# Altium footprint library Dr.Xiong_20160818.PcbLib: 266 footprints (part 8 of 17)
Each footprint in its own frame and in the unit in brackets; x right, y up, seen from the top. Pads: shape width x height; smd on the part's side, far side on the other; paste and mask are expansions set on the pad; w line width, h text height; cw(c..) or ccw(c..) is an arc to the next point about the centre after c.
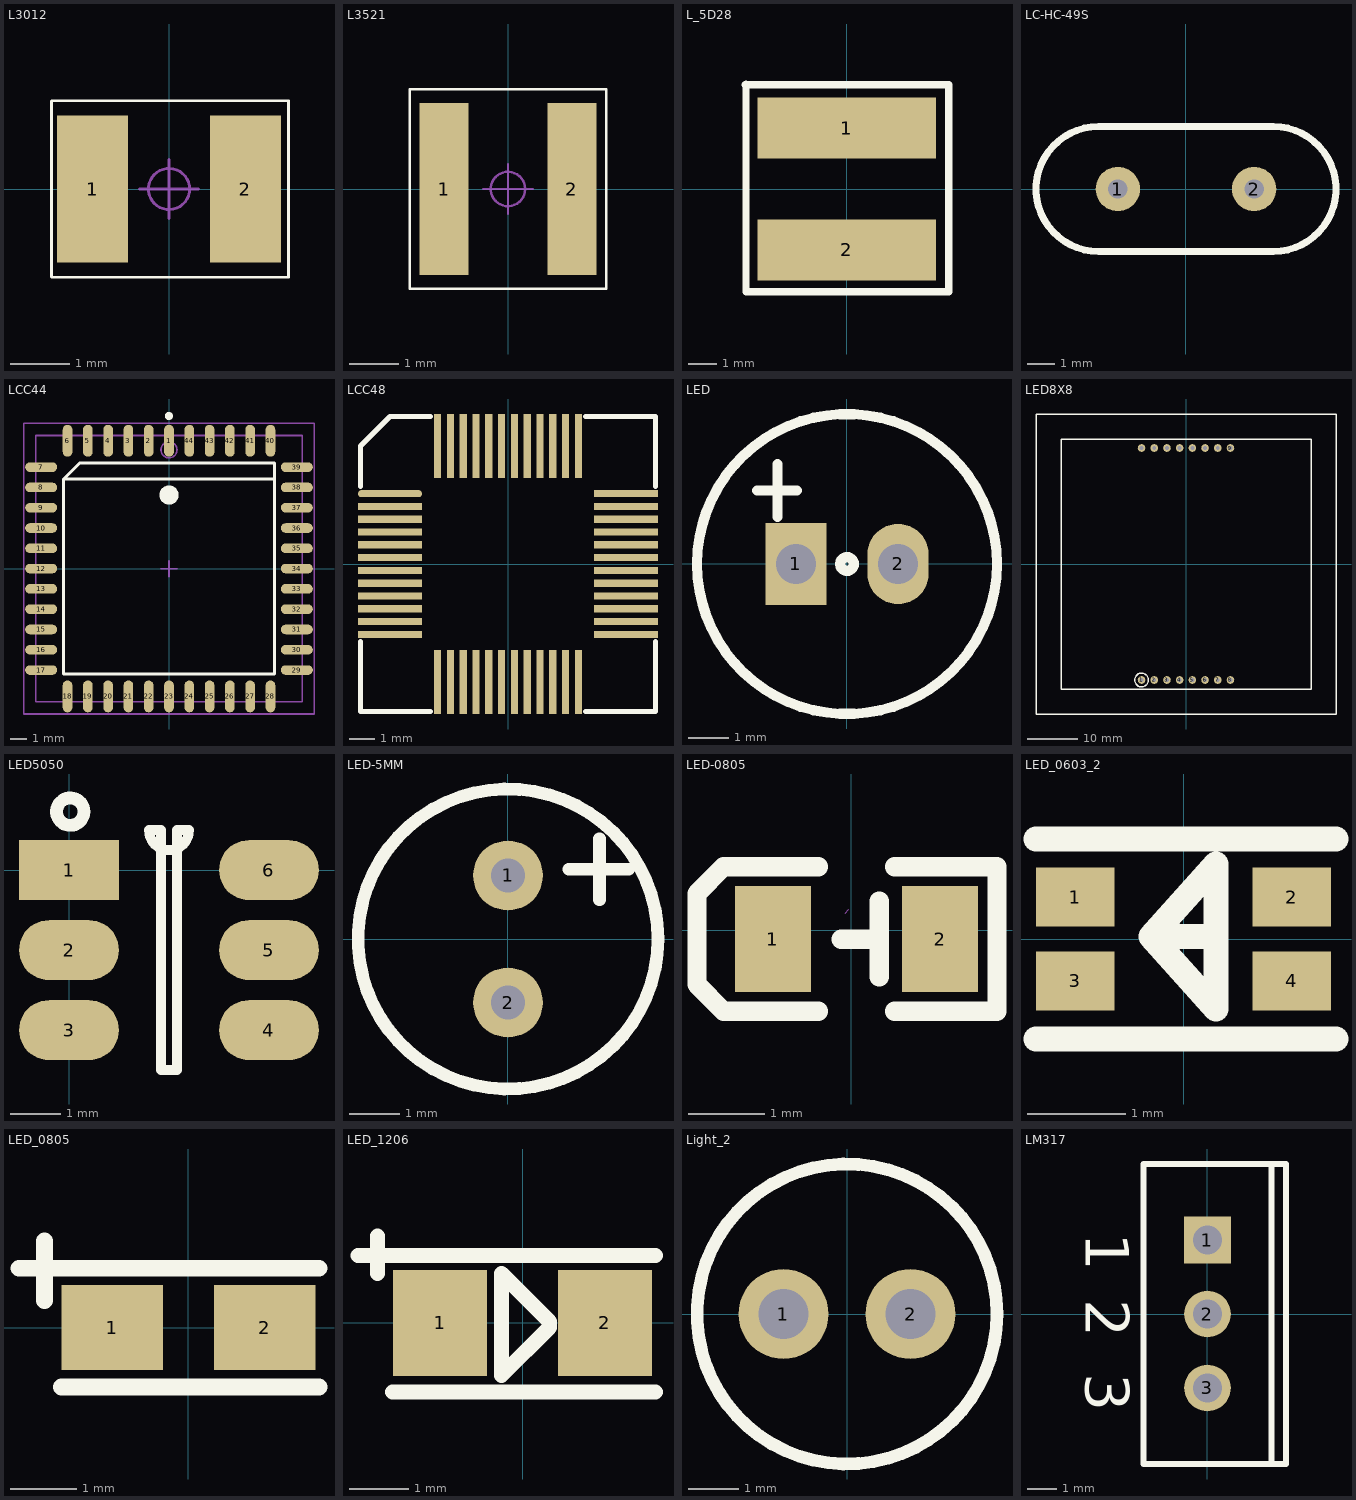
[diagram p7: the footprints below, top view; thin cyan lines are the x and y axes]

## L3012 [mm]
pads (2):
  rect 1.2x2.5 smd: 1(-1.3,0) 2(1.3,0)
Top Overlay:
  lines w0.05: -2,-1.499 2.032,-1.5 2.032,1.5 -2,1.499 -2,-1.499
Mechanical 16:
  circle w0.05: c0,0 r0.35
  lines w0.05: -0.5,0 0.5,0 ; 0,-0.5 0,0.5

## L3521 [mm]
pads (2):
  rect 1x3.5 smd: 1(-1.3,0) 2(1.3,0)
Top Overlay:
  lines w0.05: -2,-2.028 2,-2.028 2,2.028 -2,2.028 -2,-2.028
Mechanical 16:
  circle w0.05: c0,0 r0.35
  lines w0.05: -0.5,0 0.5,0 ; 0,-0.5 0,0.5

## L_5D28 [mm]
pads (2):
  rect 6.3x2.15 smd: 1(0,2.15) 2(0,-2.15)
Top Overlay:
  lines w0.254: -3.581,3.683 3.607,3.683 3.607,-3.632 -3.556,-3.632 -3.556,3.708

## LC-HC-49S [mm]
pads (2):
  round 1.6 hole 0.7: 1(-2.45,0) 2(2.45,0)
Top Overlay:
  lines w0.254: -3.15,-2.248 cw(c-3.15,0) -3.15,2.248 3.15,2.248 cw(c3.15,0) 3.15,-2.248 -3.15,-2.248
3D body "hc-49s_n.stp": height 3.6, standoff -2.9, extent -5.388,-2.27 5.412,2.23

## LCC44 [mm]
pads (44):
  oval 0.6x2 smd: 1(0,8) 2(-1.27,8) 3(-2.54,8) 4(-3.81,8) 5(-5.08,8) 6(-6.35,8) 18(-6.35,-8) 19(-5.08,-8) 20(-3.81,-8) 21(-2.54,-8) 22(-1.27,-8) 23(0,-8) 24(1.27,-8) 25(2.54,-8) 26(3.81,-8) 27(5.08,-8) 28(6.35,-8) 40(6.35,8) 41(5.08,8) 42(3.81,8) 43(2.54,8) 44(1.27,8)
  oval 2x0.6 smd: 7(-8,6.35) 8(-8,5.08) 9(-8,3.81) 10(-8,2.54) 11(-8,1.27) 12(-8,0) 13(-8,-1.27) 14(-8,-2.54) 15(-8,-3.81) 16(-8,-5.08) 17(-8,-6.35) 29(8,-6.35) 30(8,-5.08) 31(8,-3.81) 32(8,-2.54) 33(8,-1.27) 34(8,0) 35(8,1.27) 36(8,2.54) 37(8,3.81) 38(8,5.08) 39(8,6.35)
Top Overlay:
  circle w0.6: c0,4.6 r0.3
  circle w0.25: c0,9.55 r0.125
  lines w0.2: 6.6,5.6 -6.6,5.6 ; -6.6,5.6 -6.6,-6.6 6.6,-6.6 6.6,6.6 -5.6,6.6 -6.6,5.6
Mechanical 13:
  circle w0.1: c0,7.43 r0.5
  lines w0.1: -8.33,-8.33 8.33,-8.33 8.33,8.33 -8.33,8.33 -8.33,-8.33
Mechanical 15:
  lines w0.1: -0.5,0 0.5,0 ; 0,-0.5 0,0.5 ; -9.1,-9.1 9.1,-9.1 9.1,9.1 -9.1,9.1 -9.1,-9.1
3D body: height 4.58, standoff 0, extent -8.33,-8.33 8.33,8.33

## LCC48 [mm]
pads (48):
  oval 2.5x0.28 smd: 1(-4.615,2.75)
  rect 2.5x0.28 smd: 2(-4.615,2.25) 3(-4.615,1.75) 4(-4.615,1.25) 5(-4.615,0.75) 6(-4.615,0.25) 7(-4.615,-0.25) 8(-4.615,-0.75) 9(-4.615,-1.25) 10(-4.615,-1.75) 11(-4.615,-2.25) 12(-4.615,-2.75) 25(4.615,-2.75) 26(4.615,-2.25) 27(4.615,-1.75) 28(4.615,-1.25) 29(4.615,-0.75) 30(4.615,-0.25) 31(4.615,0.25) 32(4.615,0.75) 33(4.615,1.25) 34(4.615,1.75) 35(4.615,2.25) 36(4.615,2.75)
  rect 0.28x2.5 smd: 13(-2.75,-4.615) 14(-2.25,-4.615) 15(-1.75,-4.615) 16(-1.25,-4.615) 17(-0.75,-4.615) 18(-0.25,-4.615) 19(0.25,-4.615) 20(0.75,-4.615) 21(1.25,-4.615) 22(1.75,-4.615) 23(2.25,-4.615) 24(2.75,-4.615) 37(2.75,4.615) 38(2.25,4.615) 39(1.75,4.615) 40(1.25,4.615) 41(0.75,4.615) 42(0.25,4.615) 43(-0.25,4.615) 44(-0.75,4.615) 45(-1.25,4.615) 46(-1.75,4.615) 47(-2.25,4.615) 48(-2.75,4.615)
Top Overlay:
  lines w0.2: -5.765,-3.03 -5.765,-5.765 -3.03,-5.765 ; -5.765,3.03 -5.765,4.615 -4.615,5.765 -3.03,5.765 ; 3.03,-5.765 5.765,-5.765 5.765,-3.03 ; 3.03,5.765 5.765,5.765 5.765,3.03

## LED [mm]
pads (2):
  rect 1.524x2.032 hole 1: 1(-1.27,0)
  oval 1.524x2 hole 1: 2(1.27,0)
Top Overlay:
  circle w0.254: c0,0 r3.734
  circle w0.254: c0,0 r0.17
  lines w0.254: -2.235,1.829 -1.245,1.829 ; -1.727,1.168 -1.727,1.219 -1.727,2.489

## LED8X8 [mil]
pads (16):
  round 60 hole 30: 1(-350,-913.39) 2(-250,-913.39) 3(-150,-913.39) 4(-50,-913.39) 5(50,-913.39) 6(150,-913.39) 7(250,-913.39) 8(350,-913.39) 9(350,913.39) 10(250,913.39) 11(150,913.39) 12(50,913.39) 13(-50,913.39) 14(-150,913.39) 15(-250,913.39) 16(-350,913.39)
Top Overlay:
  circle w10: c-350,-913.39 r54.18
  lines w10: -1181.1,-1181.1 1181.1,-1181.1 1181.1,1181.1 -1181.1,1181.1 -1181.1,-1181.1 ; -984.25,-984.25 -984.25,984.25 984.25,984.25 984.25,-984.25 -984.25,-984.25

## LED5050 [mm]
pads (6):
  rect 2x1.2 smd: 1(0,0)
  oval 2x1.2 smd: 2(0,-1.6) 3(0,-3.2) 4(4,-3.2) 5(4,-1.6) 6(4,0)
Top Overlay:
  circle w0.254: c0.025,1.168 r0.275
  lines w0.2: 1.6,0.8 ccw(c2,0.8) 2.4,0.8 2.165,0.8 2.165,-4 1.835,-4 1.835,0.8 1.6,0.8

## LED-5MM [mil]
pads (2):
  round 55 hole 27: 1(0,50) 2(0,-50)
Top Overlay:
  circle w10: c0,0 r118.11
  lines w10: 48,55 95,55 ; 72,31 72,79

## LED-0805 [mm]
pads (2):
  rect 1x1.4 smd: 1(-1.032,-0.117) 2(1.168,-0.117)
Top Overlay:
  lines w0.254: -0.432,-1.067 -1.682,-1.067 ; -0.432,0.833 -1.682,0.833 ; -0.132,-0.122 0.368,-0.122 ; 0.368,-0.617 0.368,0.383 ; 0.568,-1.067 1.918,-1.067 1.918,0.833 0.568,0.833 ; -1.682,-1.067 -2.032,-0.717 -2.032,0.483 -1.682,0.833 ; -1.682,-1.067 -1.682,-1.067 ; -1.682,0.833 -1.682,0.833
Mechanical 15:
  lines w0.003: -0.082,0.221 -0.032,0.272

## LED_0603_2 [mm]
pads (4):
  rect 0.8x0.6 smd: 1(-1.1,0.425) 2(1.1,0.425) 3(-1.1,-0.425) 4(1.1,-0.425)
Top Overlay:
  lines w0.254: -1.499,-1.016 1.549,-1.016 ; -1.499,1.016 1.549,1.016 ; 0.33,0.025 -0.33,0.025 ; -0.33,0.025 0.33,0.762 0.33,-0.711 -0.33,0.025

## LED_0805 [mil]
pads (2):
  rect 60x50 smd: 1(-45,0) 2(45,0)
Top Overlay:
  lines w10: -100,35 -69,35 ; -85,16 -85,51 ; -75,-35 77,-35 ; -70,35 77,35

## LED_1206 [mm]
pads (2):
  rect 1.6x1.8 smd: 1(-1.4,0) 2(1.4,0)
Top Overlay:
  lines w0.254: -2.794,1.143 -2.108,1.143 ; -2.464,0.838 -2.464,1.473 ; -2.21,-1.168 2.261,-1.168 ; -2.159,1.143 2.261,1.143 ; -0.356,-0.889 -0.356,-0.305 -0.356,0.838 0.457,0.025 0.457,-0.076 -0.356,-0.889

## Light_2 [mm]
pads (2):
  round 1.8 hole 1: 1(-1.27,0) 2(1.27,0)
Top Overlay:
  circle w0.254: c0,0 r3

## LM317 [mm]
pads (3):
  rect 1.6x1.6 hole 1: 1(0,2.54)
  round 1.6 hole 1: 2(0,0) 3(0,-2.54)
Top Overlay:
  lines w0.2: 2.2,-5.15 2.2,5.15 ; -2.2,-5.15 2.7,-5.15 2.7,5.15 -2.2,5.15 -2.2,-5.15
  text "3" at -4.175,-2.04 h1.5
  text "2" at -4.175,0.5 h1.5
  text "1" at -4.175,2.79 h1.5